# Altium footprint library Package_DIP.PcbLib: 236 footprints (part 12 of 15)
Each footprint in its own frame and in the unit in brackets; x right, y up, seen from the top. Pads: shape width x height; smd on the part's side, far side on the other; paste and mask are expansions set on the pad; w line width, h text height; cw(c..) or ccw(c..) is an arc to the next point about the centre after c.
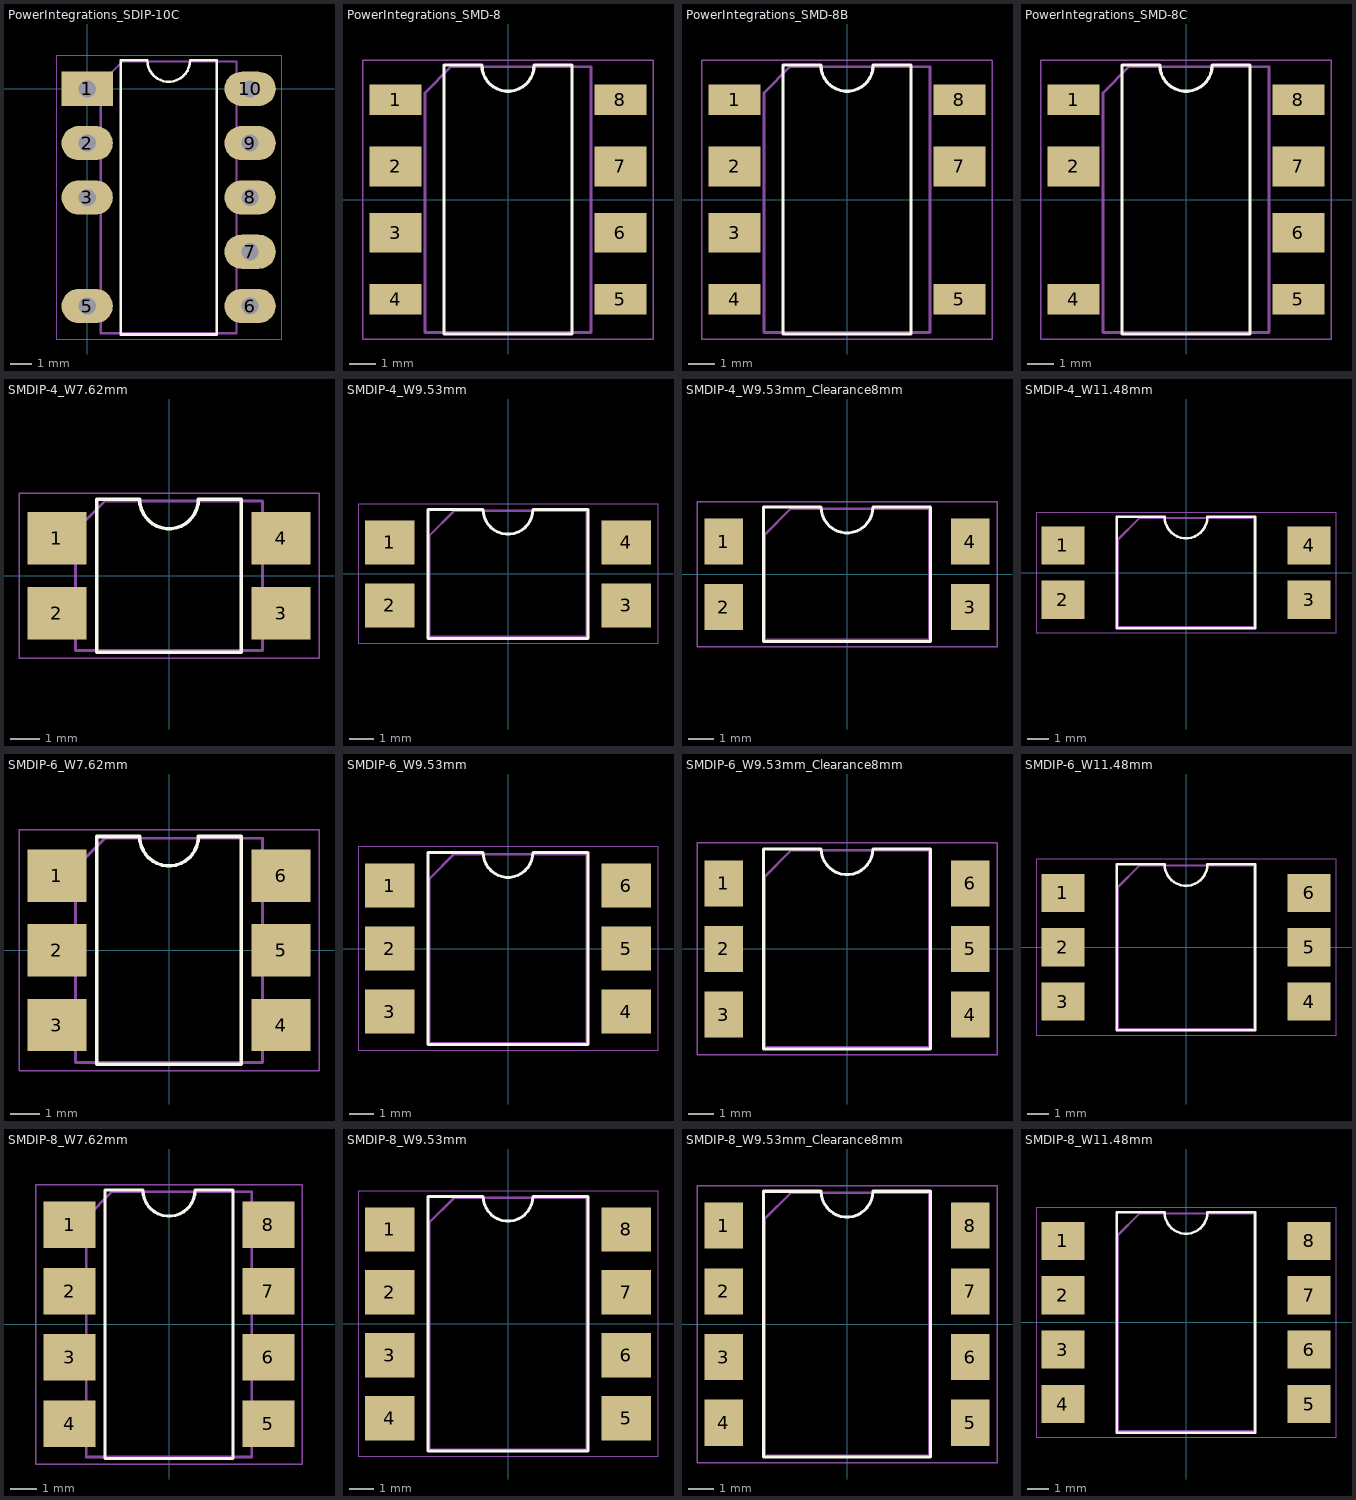
[diagram p11: the footprints below, top view; thin cyan lines are the x and y axes]

## PowerIntegrations_SDIP-10C [mm]
pads (9):
  rect 2.4x1.6 hole 0.8: 1(0,0)
  rrect100% 2.4x1.6 hole 0.8: 2(0,-2.54) 3(0,-5.08) 5(0,-10.16) 6(7.62,-10.16) 7(7.62,-7.62) 8(7.62,-5.08) 9(7.62,-2.54) 10(7.62,0)
F.SilkS:
  lines w0.12: 1.56,-11.49 6.06,-11.49 6.06,1.33 4.81,1.33 cw(c3.81,1.33) 2.81,1.33 1.56,1.33 1.56,-11.49
F.CrtYd:
  lines w0.05: -1.45,-11.7 -1.45,1.55 9.1,1.55 9.1,-11.7 -1.45,-11.7
F.Fab:
  lines w0.1: 0.635,-11.43 0.635,0.27 1.635,1.27 6.985,1.27 6.985,-11.43 0.635,-11.43
  text "'.Designator'" at -0.237,-5.92 h1

## PowerIntegrations_SMD-8 [mm]
pads (8):
  rect 2x1.17 smd: 1(-4.3,3.81) 4(-4.3,-3.81) 5(4.3,-3.81) 8(4.3,3.81)
  rect 2x1.52 smd: 2(-4.3,1.27) 3(-4.3,-1.27) 6(4.3,-1.27) 7(4.3,1.27)
F.SilkS:
  lines w0.12: -2.45,-5.14 -2.45,5.14 -1,5.14 ccw(c0,5.14) 1,5.14 2.45,5.14 2.45,-5.14 -2.45,-5.14
F.CrtYd:
  lines w0.05: -5.55,-5.33 -5.55,5.33 5.55,5.33 5.55,-5.33 -5.55,-5.33
F.Fab:
  lines w0.1: -3.175,-5.08 -3.175,4.08 -2.175,5.08 3.175,5.08 3.175,-5.08 -3.175,-5.08
  text "'.Designator'" at -4.047,-0.84 h1

## PowerIntegrations_SMD-8B [mm]
pads (7):
  rect 2x1.17 smd: 1(-4.3,3.81) 4(-4.3,-3.81) 5(4.3,-3.81) 8(4.3,3.81)
  rect 2x1.52 smd: 2(-4.3,1.27) 3(-4.3,-1.27) 7(4.3,1.27)
F.SilkS:
  lines w0.12: -2.45,-5.14 -2.45,5.14 -1,5.14 ccw(c0,5.14) 1,5.14 2.45,5.14 2.45,-5.14 -2.45,-5.14
F.CrtYd:
  lines w0.05: -5.55,-5.33 -5.55,5.33 5.55,5.33 5.55,-5.33 -5.55,-5.33
F.Fab:
  lines w0.1: -3.175,-5.08 3.175,-5.08 3.175,5.08 -2.175,5.08 -3.175,4.08 -3.175,-5.08
  text "'.Designator'" at -4.047,-0.84 h1

## PowerIntegrations_SMD-8C [mm]
pads (7):
  rect 2x1.17 smd: 1(-4.3,3.81) 4(-4.3,-3.81) 5(4.3,-3.81) 8(4.3,3.81)
  rect 2x1.52 smd: 2(-4.3,1.27) 6(4.3,-1.27) 7(4.3,1.27)
F.SilkS:
  lines w0.12: -2.45,-5.14 2.45,-5.14 2.45,5.14 1,5.14 cw(c0,5.14) -1,5.14 -2.45,5.14 -2.45,-5.14
F.CrtYd:
  lines w0.05: -5.55,-5.33 5.55,-5.33 5.55,5.33 -5.55,5.33 -5.55,-5.33
F.Fab:
  lines w0.1: -3.175,-5.08 3.175,-5.08 3.175,5.08 -2.175,5.08 -3.175,4.08 -3.175,-5.08
  text "'.Designator'" at -4.047,-0.84 h1

## SMDIP-4_W7.62mm [mm]
pads (4):
  rect 2x1.78 smd: 1(-3.81,1.27) 2(-3.81,-1.27) 3(3.81,-1.27) 4(3.81,1.27)
F.SilkS:
  lines w0.12: -2.45,-2.6 2.45,-2.6 2.45,2.6 1,2.6 cw(c0,2.6) -1,2.6 -2.45,2.6 -2.45,-2.6
F.CrtYd:
  lines w0.05: -5.1,-2.8 -5.1,2.8 5.1,2.8 5.1,-2.8 -5.1,-2.8
F.Fab:
  lines w0.1: -3.175,-2.54 -3.175,1.54 -2.175,2.54 3.175,2.54 3.175,-2.54 -3.175,-2.54
  text "'.Designator'" at -4.047,-0.84 h1

## SMDIP-4_W9.53mm [mm]
pads (4):
  rect 2x1.78 smd: 1(-4.765,1.27) 2(-4.765,-1.27) 3(4.765,-1.27) 4(4.765,1.27)
F.SilkS:
  lines w0.12: -3.235,-2.6 -3.235,2.6 -1,2.6 ccw(c0,2.6) 1,2.6 3.235,2.6 3.235,-2.6 -3.235,-2.6
F.CrtYd:
  lines w0.05: -6.05,-2.8 -6.05,2.8 6.05,2.8 6.05,-2.8 -6.05,-2.8
F.Fab:
  lines w0.1: -3.175,-2.54 -3.175,1.54 -2.175,2.54 3.175,2.54 3.175,-2.54 -3.175,-2.54
  text "'.Designator'" at -4.047,-0.84 h1

## SMDIP-4_W9.53mm_Clearance8mm [mm]
pads (4):
  rect 1.5x1.78 smd: 1(-4.765,1.27) 2(-4.765,-1.27) 3(4.765,-1.27) 4(4.765,1.27)
F.SilkS:
  lines w0.12: -3.235,-2.6 -3.235,2.6 -1,2.6 ccw(c0,2.6) 1,2.6 3.235,2.6 3.235,-2.6 -3.235,-2.6
F.CrtYd:
  lines w0.05: -5.8,-2.8 -5.8,2.8 5.8,2.8 5.8,-2.8 -5.8,-2.8
F.Fab:
  lines w0.1: -3.175,-2.54 -3.175,1.54 -2.175,2.54 3.175,2.54 3.175,-2.54 -3.175,-2.54
  text "'.Designator'" at -4.047,-0.84 h1

## SMDIP-4_W11.48mm [mm]
pads (4):
  rect 2x1.78 smd: 1(-5.74,1.27) 2(-5.74,-1.27) 3(5.74,-1.27) 4(5.74,1.27)
F.SilkS:
  lines w0.12: -3.235,-2.6 -3.235,2.6 -1,2.6 ccw(c0,2.6) 1,2.6 3.235,2.6 3.235,-2.6 -3.235,-2.6
F.CrtYd:
  lines w0.05: -7,-2.8 -7,2.8 7,2.8 7,-2.8 -7,-2.8
F.Fab:
  lines w0.1: -3.175,-2.54 -3.175,1.54 -2.175,2.54 3.175,2.54 3.175,-2.54 -3.175,-2.54
  text "'.Designator'" at -4.047,-0.84 h1

## SMDIP-6_W7.62mm [mm]
pads (6):
  rect 2x1.78 smd: 1(-3.81,2.54) 2(-3.81,0) 3(-3.81,-2.54) 4(3.81,-2.54) 5(3.81,0) 6(3.81,2.54)
F.SilkS:
  lines w0.12: -2.45,-3.87 -2.45,3.87 -1,3.87 ccw(c0,3.87) 1,3.87 2.45,3.87 2.45,-3.87 -2.45,-3.87
F.CrtYd:
  lines w0.05: -5.1,-4.1 5.1,-4.1 5.1,4.1 -5.1,4.1 -5.1,-4.1
F.Fab:
  lines w0.1: -3.175,-3.81 3.175,-3.81 3.175,3.81 -2.175,3.81 -3.175,2.81 -3.175,-3.81
  text "'.Designator'" at -4.047,-0.84 h1

## SMDIP-6_W9.53mm [mm]
pads (6):
  rect 2x1.78 smd: 1(-4.765,2.54) 2(-4.765,0) 3(-4.765,-2.54) 4(4.765,-2.54) 5(4.765,0) 6(4.765,2.54)
F.SilkS:
  lines w0.12: -3.235,-3.87 -3.235,3.87 -1,3.87 ccw(c0,3.87) 1,3.87 3.235,3.87 3.235,-3.87 -3.235,-3.87
F.CrtYd:
  lines w0.05: -6.05,-4.1 6.05,-4.1 6.05,4.1 -6.05,4.1 -6.05,-4.1
F.Fab:
  lines w0.1: -3.175,-3.81 3.175,-3.81 3.175,3.81 -2.175,3.81 -3.175,2.81 -3.175,-3.81
  text "'.Designator'" at -4.047,-0.84 h1

## SMDIP-6_W9.53mm_Clearance8mm [mm]
pads (6):
  rect 1.5x1.78 smd: 1(-4.765,2.54) 2(-4.765,0) 3(-4.765,-2.54) 4(4.765,-2.54) 5(4.765,0) 6(4.765,2.54)
F.SilkS:
  lines w0.12: -3.235,-3.87 3.235,-3.87 3.235,3.87 1,3.87 cw(c0,3.87) -1,3.87 -3.235,3.87 -3.235,-3.87
F.CrtYd:
  lines w0.05: -5.8,-4.1 -5.8,4.1 5.8,4.1 5.8,-4.1 -5.8,-4.1
F.Fab:
  lines w0.1: -3.175,-3.81 -3.175,2.81 -2.175,3.81 3.175,3.81 3.175,-3.81 -3.175,-3.81
  text "'.Designator'" at -4.047,-0.84 h1

## SMDIP-6_W11.48mm [mm]
pads (6):
  rect 2x1.78 smd: 1(-5.74,2.54) 2(-5.74,0) 3(-5.74,-2.54) 4(5.74,-2.54) 5(5.74,0) 6(5.74,2.54)
F.SilkS:
  lines w0.12: -3.235,-3.87 3.235,-3.87 3.235,3.87 1,3.87 cw(c0,3.87) -1,3.87 -3.235,3.87 -3.235,-3.87
F.CrtYd:
  lines w0.05: -7,-4.1 -7,4.1 7,4.1 7,-4.1 -7,-4.1
F.Fab:
  lines w0.1: -3.175,-3.81 -3.175,2.81 -2.175,3.81 3.175,3.81 3.175,-3.81 -3.175,-3.81
  text "'.Designator'" at -4.047,-0.84 h1

## SMDIP-8_W7.62mm [mm]
pads (8):
  rect 2x1.78 smd: 1(-3.81,3.81) 2(-3.81,1.27) 3(-3.81,-1.27) 4(-3.81,-3.81) 5(3.81,-3.81) 6(3.81,-1.27) 7(3.81,1.27) 8(3.81,3.81)
F.SilkS:
  lines w0.12: -2.45,-5.14 2.45,-5.14 2.45,5.14 1,5.14 cw(c0,5.14) -1,5.14 -2.45,5.14 -2.45,-5.14
F.CrtYd:
  lines w0.05: -5.1,-5.35 -5.1,5.35 5.1,5.35 5.1,-5.35 -5.1,-5.35
F.Fab:
  lines w0.1: -3.175,-5.08 -3.175,4.08 -2.175,5.08 3.175,5.08 3.175,-5.08 -3.175,-5.08
  text "'.Designator'" at -4.047,-0.84 h1

## SMDIP-8_W9.53mm [mm]
pads (8):
  rect 2x1.78 smd: 1(-4.765,3.81) 2(-4.765,1.27) 3(-4.765,-1.27) 4(-4.765,-3.81) 5(4.765,-3.81) 6(4.765,-1.27) 7(4.765,1.27) 8(4.765,3.81)
F.SilkS:
  lines w0.12: -3.235,-5.14 -3.235,5.14 -1,5.14 ccw(c0,5.14) 1,5.14 3.235,5.14 3.235,-5.14 -3.235,-5.14
F.CrtYd:
  lines w0.05: -6.05,-5.35 6.05,-5.35 6.05,5.35 -6.05,5.35 -6.05,-5.35
F.Fab:
  lines w0.1: -3.175,-5.08 3.175,-5.08 3.175,5.08 -2.175,5.08 -3.175,4.08 -3.175,-5.08
  text "'.Designator'" at -4.047,-0.84 h1

## SMDIP-8_W9.53mm_Clearance8mm [mm]
pads (8):
  rect 1.5x1.78 smd: 1(-4.765,3.81) 2(-4.765,1.27) 3(-4.765,-1.27) 4(-4.765,-3.81) 5(4.765,-3.81) 6(4.765,-1.27) 7(4.765,1.27) 8(4.765,3.81)
F.SilkS:
  lines w0.12: -3.235,-5.14 -3.235,5.14 -1,5.14 ccw(c0,5.14) 1,5.14 3.235,5.14 3.235,-5.14 -3.235,-5.14
F.CrtYd:
  lines w0.05: -5.8,-5.35 -5.8,5.35 5.8,5.35 5.8,-5.35 -5.8,-5.35
F.Fab:
  lines w0.1: -3.175,-5.08 3.175,-5.08 3.175,5.08 -2.175,5.08 -3.175,4.08 -3.175,-5.08
  text "'.Designator'" at -4.047,-0.84 h1

## SMDIP-8_W11.48mm [mm]
pads (8):
  rect 2x1.78 smd: 1(-5.74,3.81) 2(-5.74,1.27) 3(-5.74,-1.27) 4(-5.74,-3.81) 5(5.74,-3.81) 6(5.74,-1.27) 7(5.74,1.27) 8(5.74,3.81)
F.SilkS:
  lines w0.12: -3.235,-5.14 -3.235,5.14 -1,5.14 ccw(c0,5.14) 1,5.14 3.235,5.14 3.235,-5.14 -3.235,-5.14
F.CrtYd:
  lines w0.05: -7,-5.35 -7,5.35 7,5.35 7,-5.35 -7,-5.35
F.Fab:
  lines w0.1: -3.175,-5.08 -3.175,4.08 -2.175,5.08 3.175,5.08 3.175,-5.08 -3.175,-5.08
  text "'.Designator'" at -4.047,-0.84 h1